# Altium schematic symbol library TI Power Management Shunt Voltage Reference.SchLib: 1526 symbols (part 18 of 18)
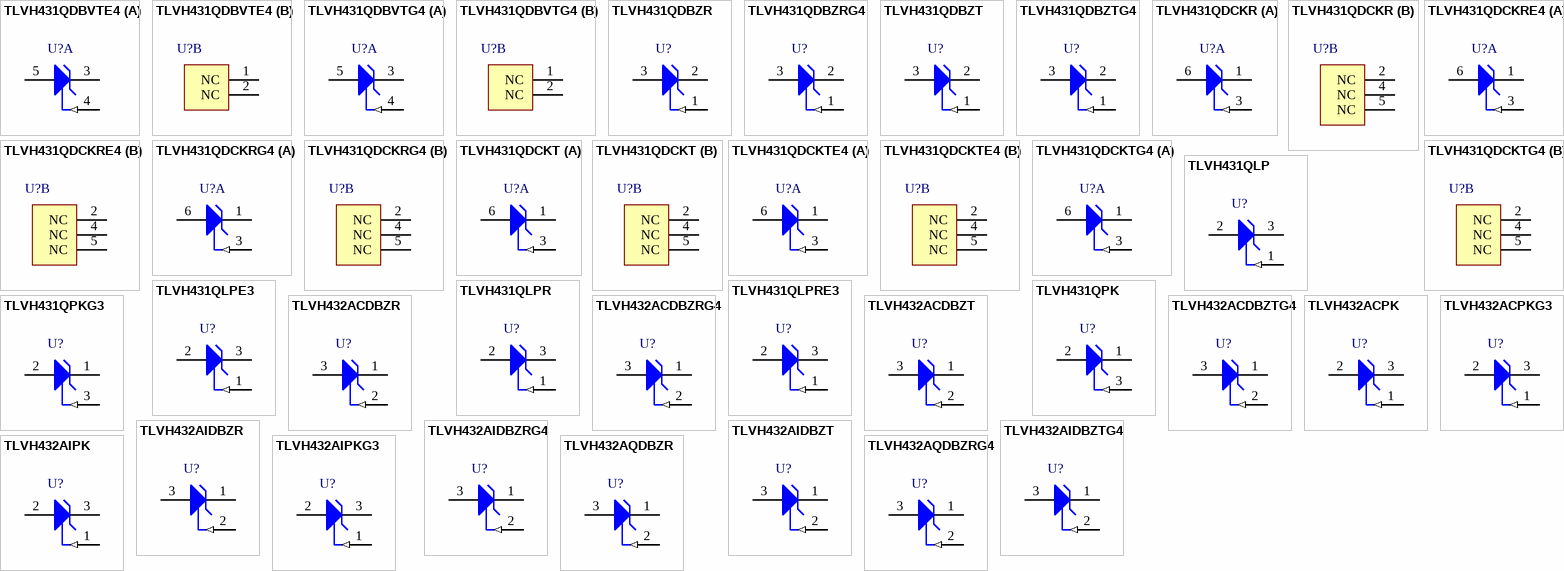
[diagram p74: symbols TLVH431QDBVTE4 to TLVH432AQDBZRG4]

## TLVH432ACDBZTG4
designator U?
Low-Voltage Adjustable Precision Shunt Regulator, 129 ppm / degC, 80 mA, 0 to 70 degC, 3-pin SOT-23 (DBZ), Green (RoHS & no Sb/Br); Manufacturer: Texas Instruments; PartNumber: TLVH432ACDBZTG4; Initial Accuracy @ 25/deg C(%): 1; Iout/Iz(Max)(mA): 80; Rating: Catalog; SubFamily: Shunt Voltage Reference; Temp Coeff(Max)(ppm/ degree C): 129; VO Adj(Max)(V): 18; VO Adj(Min)(V): 1.24; DatasheetVersion: SLVS555I; PackageVersion: 4203227/B; PackageReference: DBZ3; PackageDescription: 3-Pin Plastic Small Outline, Body 2.92 x 1.3 mm, Pitch 0.95 mm; Supplier 1: Digi-Key; Supplier Part Number 1: TLVH432ACDBZTG4-ND; Supplier 2: Mouser; Supplier Part Number 2: 595-TLVH432ACDBZTG4; Eco-Plan: Green (RoHS & no Sb/Br); Min Iz for Regulation(uA): 80; Mounting Technology: Surface Mount; Code_JEDEC: TO-236; ComponentLink1Description: Manufacturer URL; ComponentLink1URL: http://www.ti.com/; ComponentLink2Description: Datasheet; ComponentLink2URL: http://www.ti.com/general/docs/lit/getliterature.tsp?genericPartNumber=TLVH432A&fileType=pdf; ComponentLink3Description: Package Specification; ComponentLink3URL: http://www.ti.com/litv/pdf/mpds108a; ComponentLink4Description: URL Link1; ComponentLink4URL: Samples URL:http://www.ti.com/product/tlvh432a&lpos=Middle_Container&lid=Alternative_Devices
footprint TI-DBZ3_N (SOT23, 3-Leads, Body 2.92x1.3 mm, Pitch 0.95 mm, IPC Medium Density)
pins: 1 CATHODE, 2 REF (in), 3 ANODE

## TLVH432ACPK
designator U?
Low-Voltage Adjustable Precision Shunt Regulator, 129 ppm / degC, 80 mA, 0 to 70 degC, 3-pin SOT-89 (PK), Green (RoHS & no Sb/Br); Manufacturer: Texas Instruments; PartNumber: TLVH432ACPK; Initial Accuracy @ 25/deg C(%): 1; Iout/Iz(Max)(mA): 80; Rating: Catalog; SubFamily: Shunt Voltage Reference; Temp Coeff(Max)(ppm/ degree C): 129; VO Adj(Max)(V): 18; VO Adj(Min)(V): 1.24; DatasheetVersion: SLVS555I; PackageVersion: 4040234/D; PackageReference: PK3; PackageDescription: 3-Pin Plastic Small Outline, Body 2.5 x 4.5 mm, Pitch 1.5 mm; Supplier 1: Digi-Key; Supplier Part Number 1: 296-18628-2-ND; Supplier 2: Digi-Key; Supplier Part Number 2: 296-18628-1-ND; Supplier 3: Digi-Key; Supplier Part Number 3: 296-18628-6-ND; Supplier 4: Newark; Supplier Part Number 4: 57K1247; Supplier 5: Mouser; Supplier Part Number 5: 595-TLVH432ACPK; Eco-Plan: Green (RoHS & no Sb/Br); Min Iz for Regulation(uA): 80; Mounting Technology: Surface Mount; Code_JEDEC: TO-243; ComponentLink1Description: Manufacturer URL; ComponentLink1URL: http://www.ti.com/; ComponentLink2Description: Datasheet; ComponentLink2URL: http://www.ti.com/general/docs/lit/getliterature.tsp?genericPartNumber=TLVH432A&fileType=pdf; ComponentLink3Description: Package Specification; ComponentLink3URL: http://www.ti.com/litv/pdf/mhsi001b
footprint TI-PK3_N (SOT89, 3-Leads, Body 4.5x2.5mm, Pitch 1.5mm, IPC Medium Density)
pins: 1 REF (in), 2 ANODE, 3 CATHODE

## TLVH432ACPKG3
designator U?
Low-Voltage Adjustable Precision Shunt Regulator, 129 ppm / degC, 80 mA, 0 to 70 degC, 3-pin SOT-89 (PK), Green (RoHS & no Sb/Br); Manufacturer: Texas Instruments; PartNumber: TLVH432ACPKG3; Initial Accuracy @ 25/deg C(%): 1; Iout/Iz(Max)(mA): 80; Rating: Catalog; SubFamily: Shunt Voltage Reference; Temp Coeff(Max)(ppm/ degree C): 129; VO Adj(Max)(V): 18; VO Adj(Min)(V): 1.24; DatasheetVersion: SLVS555I; PackageVersion: 4040234/D; PackageReference: PK3; PackageDescription: 3-Pin Plastic Small Outline, Body 2.5 x 4.5 mm, Pitch 1.5 mm; Supplier 1: Digi-Key; Supplier Part Number 1: 296-19351-2-ND; Supplier 2: Digi-Key; Supplier Part Number 2: 296-19351-1-ND; Supplier 3: Digi-Key; Supplier Part Number 3: 296-19351-6-ND; Supplier 4: Mouser; Supplier Part Number 4: 595-TLVH432ACPKG3; Eco-Plan: Green (RoHS & no Sb/Br); Min Iz for Regulation(uA): 80; Mounting Technology: Surface Mount; Code_JEDEC: TO-243; ComponentLink1Description: Manufacturer URL; ComponentLink1URL: http://www.ti.com/; ComponentLink2Description: Datasheet; ComponentLink2URL: http://www.ti.com/general/docs/lit/getliterature.tsp?genericPartNumber=TLVH432A&fileType=pdf; ComponentLink3Description: Package Specification; ComponentLink3URL: http://www.ti.com/litv/pdf/mhsi001b
footprint TI-PK3_N (SOT89, 3-Leads, Body 4.5x2.5mm, Pitch 1.5mm, IPC Medium Density)
pins: 1 REF (in), 2 ANODE, 3 CATHODE

## TLVH432AIDBZR
designator U?
Low-Voltage Adjustable Precision Shunt Regulator, 129 ppm / degC, 80 mA, -40 to 85 degC, 3-pin SOT-23 (DBZ), Green (RoHS & no Sb/Br); Manufacturer: Texas Instruments; PartNumber: TLVH432AIDBZR; Initial Accuracy @ 25/deg C(%): 1; Iout/Iz(Max)(mA): 80; Rating: Catalog; SubFamily: Shunt Voltage Reference; Temp Coeff(Max)(ppm/ degree C): 129; VO Adj(Max)(V): 18; VO Adj(Min)(V): 1.24; DatasheetVersion: SLVS555I; PackageVersion: 4203227/B; PackageReference: DBZ3; PackageDescription: 3-Pin Plastic Small Outline, Body 2.92 x 1.3 mm, Pitch 0.95 mm; Supplier 1: Digi-Key; Supplier Part Number 1: 296-17977-2-ND; Supplier 2: Digi-Key; Supplier Part Number 2: 296-17977-1-ND; Supplier 3: Digi-Key; Supplier Part Number 3: 296-17977-6-ND; Supplier 4: Mouser; Supplier Part Number 4: 595-TLVH432AIDBZR; Eco-Plan: Green (RoHS & no Sb/Br); Min Iz for Regulation(uA): 80; Mounting Technology: Surface Mount; Code_JEDEC: TO-236; ComponentLink1Description: Manufacturer URL; ComponentLink1URL: http://www.ti.com/; ComponentLink2Description: Datasheet; ComponentLink2URL: http://www.ti.com/general/docs/lit/getliterature.tsp?genericPartNumber=TLVH432A&fileType=pdf; ComponentLink3Description: Package Specification; ComponentLink3URL: http://www.ti.com/litv/pdf/mpds108a
footprint TI-DBZ3_N (SOT23, 3-Leads, Body 2.92x1.3 mm, Pitch 0.95 mm, IPC Medium Density)
pins: 1 CATHODE, 2 REF (in), 3 ANODE

## TLVH432AIDBZRG4
designator U?
Low-Voltage Adjustable Precision Shunt Regulator, 129 ppm / degC, 80 mA, -40 to 85 degC, 3-pin SOT-23 (DBZ), Green (RoHS & no Sb/Br); Manufacturer: Texas Instruments; PartNumber: TLVH432AIDBZRG4; Initial Accuracy @ 25/deg C(%): 1; Iout/Iz(Max)(mA): 80; Rating: Catalog; SubFamily: Shunt Voltage Reference; Temp Coeff(Max)(ppm/ degree C): 129; VO Adj(Max)(V): 18; VO Adj(Min)(V): 1.24; DatasheetVersion: SLVS555I; PackageVersion: 4203227/B; PackageReference: DBZ3; PackageDescription: 3-Pin Plastic Small Outline, Body 2.92 x 1.3 mm, Pitch 0.95 mm; Supplier 1: Digi-Key; Supplier Part Number 1: TLVH432AIDBZRG4-ND; Supplier 2: Mouser; Supplier Part Number 2: 595-TLVH432AIDBZRG4; Eco-Plan: Green (RoHS & no Sb/Br); Min Iz for Regulation(uA): 80; Mounting Technology: Surface Mount; Code_JEDEC: TO-236; ComponentLink1Description: Manufacturer URL; ComponentLink1URL: http://www.ti.com/; ComponentLink2Description: Datasheet; ComponentLink2URL: http://www.ti.com/general/docs/lit/getliterature.tsp?genericPartNumber=TLVH432A&fileType=pdf; ComponentLink3Description: Package Specification; ComponentLink3URL: http://www.ti.com/litv/pdf/mpds108a
footprint TI-DBZ3_N (SOT23, 3-Leads, Body 2.92x1.3 mm, Pitch 0.95 mm, IPC Medium Density)
pins: 1 CATHODE, 2 REF (in), 3 ANODE

## TLVH432AIDBZT
designator U?
Low-Voltage Adjustable Precision Shunt Regulator, 129 ppm / degC, 80 mA, -40 to 85 degC, 3-pin SOT-23 (DBZ), Green (RoHS & no Sb/Br); Manufacturer: Texas Instruments; PartNumber: TLVH432AIDBZT; Initial Accuracy @ 25/deg C(%): 1; Iout/Iz(Max)(mA): 80; Rating: Catalog; SubFamily: Shunt Voltage Reference; Temp Coeff(Max)(ppm/ degree C): 129; VO Adj(Max)(V): 18; VO Adj(Min)(V): 1.24; DatasheetVersion: SLVS555I; PackageVersion: 4203227/B; PackageReference: DBZ3; PackageDescription: 3-Pin Plastic Small Outline, Body 2.92 x 1.3 mm, Pitch 0.95 mm; Supplier 1: Digi-Key; Supplier Part Number 1: TLVH432AIDBZT-ND; Supplier 2: Mouser; Supplier Part Number 2: 595-TLVH432AIDBZT; Eco-Plan: Green (RoHS & no Sb/Br); Min Iz for Regulation(uA): 80; Mounting Technology: Surface Mount; Code_JEDEC: TO-236; ComponentLink1Description: Manufacturer URL; ComponentLink1URL: http://www.ti.com/; ComponentLink2Description: Datasheet; ComponentLink2URL: http://www.ti.com/general/docs/lit/getliterature.tsp?genericPartNumber=TLVH432A&fileType=pdf; ComponentLink3Description: Package Specification; ComponentLink3URL: http://www.ti.com/litv/pdf/mpds108a; ComponentLink4Description: URL Link1; ComponentLink4URL: Samples URL:http://www.ti.com/product/tlvh432a&lpos=Middle_Container&lid=Alternative_Devices
footprint TI-DBZ3_N (SOT23, 3-Leads, Body 2.92x1.3 mm, Pitch 0.95 mm, IPC Medium Density)
pins: 1 CATHODE, 2 REF (in), 3 ANODE

## TLVH432AIDBZTG4
designator U?
Low-Voltage Adjustable Precision Shunt Regulator, 129 ppm / degC, 80 mA, -40 to 85 degC, 3-pin SOT-23 (DBZ), Green (RoHS & no Sb/Br); Manufacturer: Texas Instruments; PartNumber: TLVH432AIDBZTG4; Initial Accuracy @ 25/deg C(%): 1; Iout/Iz(Max)(mA): 80; Rating: Catalog; SubFamily: Shunt Voltage Reference; Temp Coeff(Max)(ppm/ degree C): 129; VO Adj(Max)(V): 18; VO Adj(Min)(V): 1.24; DatasheetVersion: SLVS555I; PackageVersion: 4203227/B; PackageReference: DBZ3; PackageDescription: 3-Pin Plastic Small Outline, Body 2.92 x 1.3 mm, Pitch 0.95 mm; Supplier 1: Digi-Key; Supplier Part Number 1: TLVH432AIDBZTG4-ND; Supplier 2: Mouser; Supplier Part Number 2: 595-TLVH432AIDBZTG4; Eco-Plan: Green (RoHS & no Sb/Br); Min Iz for Regulation(uA): 80; Mounting Technology: Surface Mount; Code_JEDEC: TO-236; ComponentLink1Description: Manufacturer URL; ComponentLink1URL: http://www.ti.com/; ComponentLink2Description: Datasheet; ComponentLink2URL: http://www.ti.com/general/docs/lit/getliterature.tsp?genericPartNumber=TLVH432A&fileType=pdf; ComponentLink3Description: Package Specification; ComponentLink3URL: http://www.ti.com/litv/pdf/mpds108a
footprint TI-DBZ3_N (SOT23, 3-Leads, Body 2.92x1.3 mm, Pitch 0.95 mm, IPC Medium Density)
pins: 1 CATHODE, 2 REF (in), 3 ANODE

## TLVH432AIPK
designator U?
Low-Voltage Adjustable Precision Shunt Regulator, 129 ppm / degC, 80 mA, -40 to 85 degC, 3-pin SOT-89 (PK), Green (RoHS & no Sb/Br); Manufacturer: Texas Instruments; PartNumber: TLVH432AIPK; Initial Accuracy @ 25/deg C(%): 1; Iout/Iz(Max)(mA): 80; Rating: Catalog; SubFamily: Shunt Voltage Reference; Temp Coeff(Max)(ppm/ degree C): 129; VO Adj(Max)(V): 18; VO Adj(Min)(V): 1.24; DatasheetVersion: SLVS555I; PackageVersion: 4040234/D; PackageReference: PK3; PackageDescription: 3-Pin Plastic Small Outline, Body 2.5 x 4.5 mm, Pitch 1.5 mm; Supplier 1: Digi-Key; Supplier Part Number 1: 296-18629-2-ND; Supplier 2: Digi-Key; Supplier Part Number 2: 296-18629-1-ND; Supplier 3: Digi-Key; Supplier Part Number 3: 296-18629-6-ND; Supplier 4: Newark; Supplier Part Number 4: 57K1248; Supplier 5: Mouser; Supplier Part Number 5: 595-TLVH432AIPK; Eco-Plan: Green (RoHS & no Sb/Br); Min Iz for Regulation(uA): 80; Mounting Technology: Surface Mount; Code_JEDEC: TO-243; ComponentLink1Description: Manufacturer URL; ComponentLink1URL: http://www.ti.com/; ComponentLink2Description: Datasheet; ComponentLink2URL: http://www.ti.com/general/docs/lit/getliterature.tsp?genericPartNumber=TLVH432A&fileType=pdf; ComponentLink3Description: Package Specification; ComponentLink3URL: http://www.ti.com/litv/pdf/mhsi001b; ComponentLink4Description: URL Link1; ComponentLink4URL: Samples URL:http://www.ti.com/product/tlvh432a&lpos=Middle_Container&lid=Alternative_Devices
footprint TI-PK3_N (SOT89, 3-Leads, Body 4.5x2.5mm, Pitch 1.5mm, IPC Medium Density)
pins: 1 REF (in), 2 ANODE, 3 CATHODE

## TLVH432AIPKG3
designator U?
Low-Voltage Adjustable Precision Shunt Regulator, 129 ppm / degC, 80 mA, -40 to 85 degC, 3-pin SOT-89 (PK), Green (RoHS & no Sb/Br); Manufacturer: Texas Instruments; PartNumber: TLVH432AIPKG3; Initial Accuracy @ 25/deg C(%): 1; Iout/Iz(Max)(mA): 80; Rating: Catalog; SubFamily: Shunt Voltage Reference; Temp Coeff(Max)(ppm/ degree C): 129; VO Adj(Max)(V): 18; VO Adj(Min)(V): 1.24; DatasheetVersion: SLVS555I; PackageVersion: 4040234/D; PackageReference: PK3; PackageDescription: 3-Pin Plastic Small Outline, Body 2.5 x 4.5 mm, Pitch 1.5 mm; Supplier 1: Digi-Key; Supplier Part Number 1: 296-19352-2-ND; Supplier 2: Digi-Key; Supplier Part Number 2: 296-19352-1-ND; Supplier 3: Digi-Key; Supplier Part Number 3: 296-19352-6-ND; Supplier 4: Newark; Supplier Part Number 4: 66K4401; Supplier 5: Mouser; Supplier Part Number 5: 595-TLVH432AIPKG3; Eco-Plan: Green (RoHS & no Sb/Br); Min Iz for Regulation(uA): 80; Mounting Technology: Surface Mount; Code_JEDEC: TO-243; ComponentLink1Description: Manufacturer URL; ComponentLink1URL: http://www.ti.com/; ComponentLink2Description: Datasheet; ComponentLink2URL: http://www.ti.com/general/docs/lit/getliterature.tsp?genericPartNumber=TLVH432A&fileType=pdf; ComponentLink3Description: Package Specification; ComponentLink3URL: http://www.ti.com/litv/pdf/mhsi001b
footprint TI-PK3_N (SOT89, 3-Leads, Body 4.5x2.5mm, Pitch 1.5mm, IPC Medium Density)
pins: 1 REF (in), 2 ANODE, 3 CATHODE

## TLVH432AQDBZR
designator U?
Low-Voltage Adjustable Precision Shunt Regulator, 129 ppm / degC, 80 mA, -40 to 125 degC, 3-pin SOT-23 (DBZ), Green (RoHS & no Sb/Br); Manufacturer: Texas Instruments; PartNumber: TLVH432AQDBZR; Initial Accuracy @ 25/deg C(%): 1; Iout/Iz(Max)(mA): 80; Rating: Catalog; SubFamily: Shunt Voltage Reference; Temp Coeff(Max)(ppm/ degree C): 129; VO Adj(Max)(V): 18; VO Adj(Min)(V): 1.24; DatasheetVersion: SLVS555I; PackageVersion: 4203227/B; PackageReference: DBZ3; PackageDescription: 3-Pin Plastic Small Outline, Body 2.92 x 1.3 mm, Pitch 0.95 mm; Supplier 1: Digi-Key; Supplier Part Number 1: 296-17978-2-ND; Supplier 2: Digi-Key; Supplier Part Number 2: 296-17978-1-ND; Supplier 3: Digi-Key; Supplier Part Number 3: 296-17978-6-ND; Supplier 4: Newark; Supplier Part Number 4: 31K7685; Supplier 5: Mouser; Supplier Part Number 5: 595-TLVH432AQDBZR; Eco-Plan: Green (RoHS & no Sb/Br); Min Iz for Regulation(uA): 80; Mounting Technology: Surface Mount; Code_JEDEC: TO-236; ComponentLink1Description: Manufacturer URL; ComponentLink1URL: http://www.ti.com/; ComponentLink2Description: Datasheet; ComponentLink2URL: http://www.ti.com/general/docs/lit/getliterature.tsp?genericPartNumber=TLVH432A&fileType=pdf; ComponentLink3Description: Package Specification; ComponentLink3URL: http://www.ti.com/litv/pdf/mpds108a
footprint TI-DBZ3_N (SOT23, 3-Leads, Body 2.92x1.3 mm, Pitch 0.95 mm, IPC Medium Density)
pins: 1 CATHODE, 2 REF (in), 3 ANODE

## TLVH432AQDBZRG4
designator U?
Low-Voltage Adjustable Precision Shunt Regulator, 129 ppm / degC, 80 mA, -40 to 125 degC, 3-pin SOT-23 (DBZ), Green (RoHS & no Sb/Br); Manufacturer: Texas Instruments; PartNumber: TLVH432AQDBZRG4; Initial Accuracy @ 25/deg C(%): 1; Iout/Iz(Max)(mA): 80; Rating: Catalog; SubFamily: Shunt Voltage Reference; Temp Coeff(Max)(ppm/ degree C): 129; VO Adj(Max)(V): 18; VO Adj(Min)(V): 1.24; DatasheetVersion: SLVS555I; PackageVersion: 4203227/B; PackageReference: DBZ3; PackageDescription: 3-Pin Plastic Small Outline, Body 2.92 x 1.3 mm, Pitch 0.95 mm; Supplier 1: Digi-Key; Supplier Part Number 1: TLVH432AQDBZRG4-ND; Supplier 2: Mouser; Supplier Part Number 2: 595-TLVH432AQDBZRG4; Eco-Plan: Green (RoHS & no Sb/Br); Min Iz for Regulation(uA): 80; Mounting Technology: Surface Mount; Code_JEDEC: TO-236; ComponentLink1Description: Manufacturer URL; ComponentLink1URL: http://www.ti.com/; ComponentLink2Description: Datasheet; ComponentLink2URL: http://www.ti.com/general/docs/lit/getliterature.tsp?genericPartNumber=TLVH432A&fileType=pdf; ComponentLink3Description: Package Specification; ComponentLink3URL: http://www.ti.com/litv/pdf/mpds108a
footprint TI-DBZ3_N (SOT23, 3-Leads, Body 2.92x1.3 mm, Pitch 0.95 mm, IPC Medium Density)
pins: 1 CATHODE, 2 REF (in), 3 ANODE

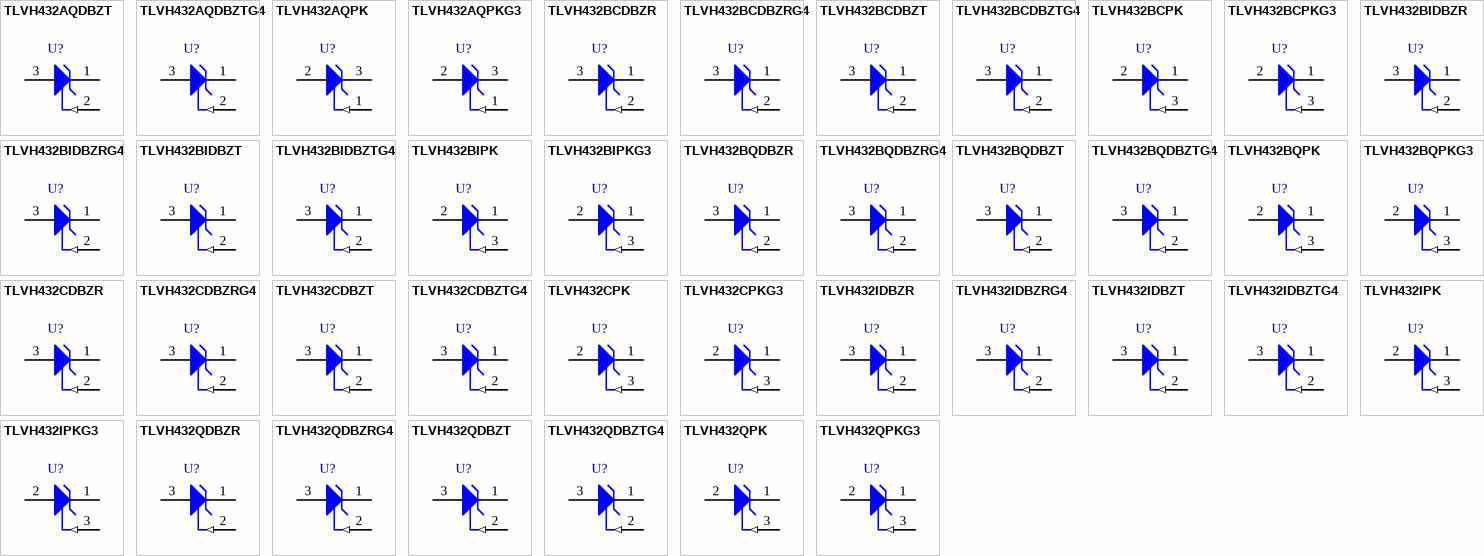
[diagram p56: symbols TLVH432AQDBZT to TLVH432QPKG3]

## TLVH432AQDBZT
designator U?
Low-Voltage Adjustable Precision Shunt Regulator, 129 ppm / degC, 80 mA, -40 to 125 degC, 3-pin SOT-23 (DBZ), Green (RoHS & no Sb/Br); Manufacturer: Texas Instruments; PartNumber: TLVH432AQDBZT; Initial Accuracy @ 25/deg C(%): 1; Iout/Iz(Max)(mA): 80; Rating: Catalog; SubFamily: Shunt Voltage Reference; Temp Coeff(Max)(ppm/ degree C): 129; VO Adj(Max)(V): 18; VO Adj(Min)(V): 1.24; DatasheetVersion: SLVS555I; PackageVersion: 4203227/B; PackageReference: DBZ3; PackageDescription: 3-Pin Plastic Small Outline, Body 2.92 x 1.3 mm, Pitch 0.95 mm; Supplier 1: Digi-Key; Supplier Part Number 1: TLVH432AQDBZT-ND; Supplier 2: Mouser; Supplier Part Number 2: 595-TLVH432AQDBZT; Eco-Plan: Green (RoHS & no Sb/Br); Min Iz for Regulation(uA): 80; Mounting Technology: Surface Mount; Code_JEDEC: TO-236; ComponentLink1Description: Manufacturer URL; ComponentLink1URL: http://www.ti.com/; ComponentLink2Description: Datasheet; ComponentLink2URL: http://www.ti.com/general/docs/lit/getliterature.tsp?genericPartNumber=TLVH432A&fileType=pdf; ComponentLink3Description: Package Specification; ComponentLink3URL: http://www.ti.com/litv/pdf/mpds108a
footprint TI-DBZ3_N (SOT23, 3-Leads, Body 2.92x1.3 mm, Pitch 0.95 mm, IPC Medium Density)
pins: 1 CATHODE, 2 REF (in), 3 ANODE

## TLVH432AQDBZTG4
designator U?
Low-Voltage Adjustable Precision Shunt Regulator, 129 ppm / degC, 80 mA, -40 to 125 degC, 3-pin SOT-23 (DBZ), Green (RoHS & no Sb/Br); Manufacturer: Texas Instruments; PartNumber: TLVH432AQDBZTG4; Initial Accuracy @ 25/deg C(%): 1; Iout/Iz(Max)(mA): 80; Rating: Catalog; SubFamily: Shunt Voltage Reference; Temp Coeff(Max)(ppm/ degree C): 129; VO Adj(Max)(V): 18; VO Adj(Min)(V): 1.24; DatasheetVersion: SLVS555I; PackageVersion: 4203227/B; PackageReference: DBZ3; PackageDescription: 3-Pin Plastic Small Outline, Body 2.92 x 1.3 mm, Pitch 0.95 mm; Supplier 1: Digi-Key; Supplier Part Number 1: TLVH432AQDBZTG4-ND; Supplier 2: Mouser; Supplier Part Number 2: 595-TLVH432AQDBZTG4; Eco-Plan: Green (RoHS & no Sb/Br); Min Iz for Regulation(uA): 80; Mounting Technology: Surface Mount; Code_JEDEC: TO-236; ComponentLink1Description: Manufacturer URL; ComponentLink1URL: http://www.ti.com/; ComponentLink2Description: Datasheet; ComponentLink2URL: http://www.ti.com/general/docs/lit/getliterature.tsp?genericPartNumber=TLVH432A&fileType=pdf; ComponentLink3Description: Package Specification; ComponentLink3URL: http://www.ti.com/litv/pdf/mpds108a; ComponentLink4Description: URL Link1; ComponentLink4URL: Samples URL:http://www.ti.com/product/tlvh432a&lpos=Middle_Container&lid=Alternative_Devices
footprint TI-DBZ3_N (SOT23, 3-Leads, Body 2.92x1.3 mm, Pitch 0.95 mm, IPC Medium Density)
pins: 1 CATHODE, 2 REF (in), 3 ANODE

## TLVH432AQPK
designator U?
Low-Voltage Adjustable Precision Shunt Regulator, 129 ppm / degC, 80 mA, -40 to 125 degC, 3-pin SOT-89 (PK), Green (RoHS & no Sb/Br); Manufacturer: Texas Instruments; PartNumber: TLVH432AQPK; Initial Accuracy @ 25/deg C(%): 1; Iout/Iz(Max)(mA): 80; Rating: Catalog; SubFamily: Shunt Voltage Reference; Temp Coeff(Max)(ppm/ degree C): 129; VO Adj(Max)(V): 18; VO Adj(Min)(V): 1.24; DatasheetVersion: SLVS555I; PackageVersion: 4040234/D; PackageReference: PK3; PackageDescription: 3-Pin Plastic Small Outline, Body 2.5 x 4.5 mm, Pitch 1.5 mm; Supplier 1: Digi-Key; Supplier Part Number 1: 296-18630-2-ND; Supplier 2: Digi-Key; Supplier Part Number 2: 296-18630-1-ND; Supplier 3: Digi-Key; Supplier Part Number 3: 296-18630-6-ND; Supplier 4: Mouser; Supplier Part Number 4: 595-TLVH432AQPK; Eco-Plan: Green (RoHS & no Sb/Br); Min Iz for Regulation(uA): 80; Mounting Technology: Surface Mount; Code_JEDEC: TO-243; ComponentLink1Description: Manufacturer URL; ComponentLink1URL: http://www.ti.com/; ComponentLink2Description: Datasheet; ComponentLink2URL: http://www.ti.com/general/docs/lit/getliterature.tsp?genericPartNumber=TLVH432A&fileType=pdf; ComponentLink3Description: Package Specification; ComponentLink3URL: http://www.ti.com/litv/pdf/mhsi001b; ComponentLink4Description: URL Link1; ComponentLink4URL: Samples URL:http://www.ti.com/product/tlvh432a
footprint TI-PK3_N (SOT89, 3-Leads, Body 4.5x2.5mm, Pitch 1.5mm, IPC Medium Density)
pins: 1 REF (in), 2 ANODE, 3 CATHODE

## TLVH432AQPKG3
designator U?
Low-Voltage Adjustable Precision Shunt Regulator, 129 ppm / degC, 80 mA, -40 to 125 degC, 3-pin SOT-89 (PK), Green (RoHS & no Sb/Br); Manufacturer: Texas Instruments; PartNumber: TLVH432AQPKG3; Initial Accuracy @ 25/deg C(%): 1; Iout/Iz(Max)(mA): 80; Rating: Catalog; SubFamily: Shunt Voltage Reference; Temp Coeff(Max)(ppm/ degree C): 129; VO Adj(Max)(V): 18; VO Adj(Min)(V): 1.24; DatasheetVersion: SLVS555I; PackageVersion: 4040234/D; PackageReference: PK3; PackageDescription: 3-Pin Plastic Small Outline, Body 2.5 x 4.5 mm, Pitch 1.5 mm; Supplier 1: Digi-Key; Supplier Part Number 1: 296-19353-2-ND; Supplier 2: Digi-Key; Supplier Part Number 2: 296-19353-1-ND; Supplier 3: Digi-Key; Supplier Part Number 3: 296-19353-6-ND; Supplier 4: Mouser; Supplier Part Number 4: 595-TLVH432AQPKG3; Eco-Plan: Green (RoHS & no Sb/Br); Min Iz for Regulation(uA): 80; Mounting Technology: Surface Mount; Code_JEDEC: TO-243; ComponentLink1Description: Manufacturer URL; ComponentLink1URL: http://www.ti.com/; ComponentLink2Description: Datasheet; ComponentLink2URL: http://www.ti.com/general/docs/lit/getliterature.tsp?genericPartNumber=TLVH432A&fileType=pdf; ComponentLink3Description: Package Specification; ComponentLink3URL: http://www.ti.com/litv/pdf/mhsi001b; ComponentLink4Description: URL Link1; ComponentLink4URL: Samples URL:http://www.ti.com/product/tlvh432a
footprint TI-PK3_N (SOT89, 3-Leads, Body 4.5x2.5mm, Pitch 1.5mm, IPC Medium Density)
pins: 1 REF (in), 2 ANODE, 3 CATHODE

## TLVH432BCDBZR
designator U?
Low-Voltage Adjustable Precision Shunt Regulator, 129 ppm / degC, 80 mA, 0 to 70 degC, 3-pin SOT-23 (DBZ), Green (RoHS & no Sb/Br); Manufacturer: Texas Instruments; PartNumber: TLVH432BCDBZR; Initial Accuracy @ 25/deg C(%): 0.5; Iout/Iz(Max)(mA): 80; Rating: Catalog; SubFamily: Shunt Voltage Reference; Temp Coeff(Max)(ppm/ degree C): 129; VO Adj(Max)(V): 18; VO Adj(Min)(V): 1.24; DatasheetVersion: SLVS555I; PackageVersion: 4203227/B; PackageReference: DBZ3; PackageDescription: 3-Pin Plastic Small Outline, Body 2.92 x 1.3 mm, Pitch 0.95 mm; Supplier 1: Digi-Key; Supplier Part Number 1: 296-17979-2-ND; Supplier 2: Digi-Key; Supplier Part Number 2: 296-17979-1-ND; Supplier 3: Digi-Key; Supplier Part Number 3: 296-17979-6-ND; Supplier 4: Newark; Supplier Part Number 4: 31K7689; Supplier 5: Mouser; Supplier Part Number 5: 595-TLVH432BCDBZR; Eco-Plan: Green (RoHS & no Sb/Br); Min Iz for Regulation(uA): 80; Mounting Technology: Surface Mount; Code_JEDEC: TO-236; ComponentLink1Description: Manufacturer URL; ComponentLink1URL: http://www.ti.com/; ComponentLink2Description: Datasheet; ComponentLink2URL: http://www.ti.com/general/docs/lit/getliterature.tsp?genericPartNumber=TLVH432B&fileType=pdf; ComponentLink3Description: Package Specification; ComponentLink3URL: http://www.ti.com/litv/pdf/mpds108a
footprint TI-DBZ3_N (SOT23, 3-Leads, Body 2.92x1.3 mm, Pitch 0.95 mm, IPC Medium Density)
pins: 1 CATHODE, 2 REF (in), 3 ANODE

## TLVH432BCDBZRG4
designator U?
Low-Voltage Adjustable Precision Shunt Regulator, 129 ppm / degC, 80 mA, 0 to 70 degC, 3-pin SOT-23 (DBZ), Green (RoHS & no Sb/Br); Manufacturer: Texas Instruments; PartNumber: TLVH432BCDBZRG4; Initial Accuracy @ 25/deg C(%): 0.5; Iout/Iz(Max)(mA): 80; Rating: Catalog; SubFamily: Shunt Voltage Reference; Temp Coeff(Max)(ppm/ degree C): 129; VO Adj(Max)(V): 18; VO Adj(Min)(V): 1.24; DatasheetVersion: SLVS555I; PackageVersion: 4203227/B; PackageReference: DBZ3; PackageDescription: 3-Pin Plastic Small Outline, Body 2.92 x 1.3 mm, Pitch 0.95 mm; Supplier 1: Digi-Key; Supplier Part Number 1: TLVH432BCDBZRG4-ND; Supplier 2: Mouser; Supplier Part Number 2: 595-TLVH432BCDBZRG4; Eco-Plan: Green (RoHS & no Sb/Br); Min Iz for Regulation(uA): 80; Mounting Technology: Surface Mount; Code_JEDEC: TO-236; ComponentLink1Description: Manufacturer URL; ComponentLink1URL: http://www.ti.com/; ComponentLink2Description: Datasheet; ComponentLink2URL: http://www.ti.com/general/docs/lit/getliterature.tsp?genericPartNumber=TLVH432B&fileType=pdf; ComponentLink3Description: Package Specification; ComponentLink3URL: http://www.ti.com/litv/pdf/mpds108a
footprint TI-DBZ3_N (SOT23, 3-Leads, Body 2.92x1.3 mm, Pitch 0.95 mm, IPC Medium Density)
pins: 1 CATHODE, 2 REF (in), 3 ANODE

## TLVH432BCDBZT
designator U?
Low-Voltage Adjustable Precision Shunt Regulator, 129 ppm / degC, 80 mA, 0 to 70 degC, 3-pin SOT-23 (DBZ), Green (RoHS & no Sb/Br); Manufacturer: Texas Instruments; PartNumber: TLVH432BCDBZT; Initial Accuracy @ 25/deg C(%): 0.5; Iout/Iz(Max)(mA): 80; Rating: Catalog; SubFamily: Shunt Voltage Reference; Temp Coeff(Max)(ppm/ degree C): 129; VO Adj(Max)(V): 18; VO Adj(Min)(V): 1.24; DatasheetVersion: SLVS555I; PackageVersion: 4203227/B; PackageReference: DBZ3; PackageDescription: 3-Pin Plastic Small Outline, Body 2.92 x 1.3 mm, Pitch 0.95 mm; Supplier 1: Digi-Key; Supplier Part Number 1: TLVH432BCDBZT-ND; Supplier 2: Mouser; Supplier Part Number 2: 595-TLVH432BCDBZT; Eco-Plan: Green (RoHS & no Sb/Br); Min Iz for Regulation(uA): 80; Mounting Technology: Surface Mount; Code_JEDEC: TO-236; ComponentLink1Description: Manufacturer URL; ComponentLink1URL: http://www.ti.com/; ComponentLink2Description: Datasheet; ComponentLink2URL: http://www.ti.com/general/docs/lit/getliterature.tsp?genericPartNumber=TLVH432B&fileType=pdf; ComponentLink3Description: Package Specification; ComponentLink3URL: http://www.ti.com/litv/pdf/mpds108a
footprint TI-DBZ3_N (SOT23, 3-Leads, Body 2.92x1.3 mm, Pitch 0.95 mm, IPC Medium Density)
pins: 1 CATHODE, 2 REF (in), 3 ANODE

## TLVH432BCDBZTG4
designator U?
Low-Voltage Adjustable Precision Shunt Regulator, 129 ppm / degC, 80 mA, 0 to 70 degC, 3-pin SOT-23 (DBZ), Green (RoHS & no Sb/Br); Manufacturer: Texas Instruments; PartNumber: TLVH432BCDBZTG4; Initial Accuracy @ 25/deg C(%): 0.5; Iout/Iz(Max)(mA): 80; Rating: Catalog; SubFamily: Shunt Voltage Reference; Temp Coeff(Max)(ppm/ degree C): 129; VO Adj(Max)(V): 18; VO Adj(Min)(V): 1.24; DatasheetVersion: SLVS555I; PackageVersion: 4203227/B; PackageReference: DBZ3; PackageDescription: 3-Pin Plastic Small Outline, Body 2.92 x 1.3 mm, Pitch 0.95 mm; Supplier 1: Digi-Key; Supplier Part Number 1: TLVH432BCDBZTG4-ND; Supplier 2: Mouser; Supplier Part Number 2: 595-TLVH432BCDBZTG4; Eco-Plan: Green (RoHS & no Sb/Br); Min Iz for Regulation(uA): 80; Mounting Technology: Surface Mount; Code_JEDEC: TO-236; ComponentLink1Description: Manufacturer URL; ComponentLink1URL: http://www.ti.com/; ComponentLink2Description: Datasheet; ComponentLink2URL: http://www.ti.com/general/docs/lit/getliterature.tsp?genericPartNumber=TLVH432B&fileType=pdf; ComponentLink3Description: Package Specification; ComponentLink3URL: http://www.ti.com/litv/pdf/mpds108a
footprint TI-DBZ3_N (SOT23, 3-Leads, Body 2.92x1.3 mm, Pitch 0.95 mm, IPC Medium Density)
pins: 1 CATHODE, 2 REF (in), 3 ANODE

## TLVH432BCPK
designator U?
Low-Voltage Adjustable Precision Shunt Regulator, 129 ppm / degC, 80 mA, 0 to 70 degC, 3-pin SOT-89 (PK), Green (RoHS & no Sb/Br); Manufacturer: Texas Instruments; PartNumber: TLVH432BCPK; Initial Accuracy @ 25/deg C(%): 0.5; Iout/Iz(Max)(mA): 80; Rating: Catalog; SubFamily: Shunt Voltage Reference; Temp Coeff(Max)(ppm/ degree C): 129; VO Adj(Max)(V): 18; VO Adj(Min)(V): 1.24; DatasheetVersion: SLVS555I; PackageVersion: 4040234/D; PackageReference: PK3; PackageDescription: 3-Pin Plastic Small Outline, Body 2.5 x 4.5 mm, Pitch 1.5 mm; Supplier 1: Digi-Key; Supplier Part Number 1: 296-18631-2-ND; Supplier 2: Digi-Key; Supplier Part Number 2: 296-18631-1-ND; Supplier 3: Digi-Key; Supplier Part Number 3: 296-18631-6-ND; Supplier 4: Newark; Supplier Part Number 4: 57K1250; Supplier 5: Mouser; Supplier Part Number 5: 595-TLVH432BCPK; Eco-Plan: Green (RoHS & no Sb/Br); Min Iz for Regulation(uA): 80; Mounting Technology: Surface Mount; Code_JEDEC: TO-243; ComponentLink1Description: Manufacturer URL; ComponentLink1URL: http://www.ti.com/; ComponentLink2Description: Datasheet; ComponentLink2URL: http://www.ti.com/general/docs/lit/getliterature.tsp?genericPartNumber=TLVH432B&fileType=pdf; ComponentLink3Description: Package Specification; ComponentLink3URL: http://www.ti.com/litv/pdf/mhsi001b
footprint TI-PK3_N (SOT89, 3-Leads, Body 4.5x2.5mm, Pitch 1.5mm, IPC Medium Density)
pins: 1 CATHODE, 2 ANODE, 3 REF (in)

## TLVH432BCPKG3
designator U?
Low-Voltage Adjustable Precision Shunt Regulator, 129 ppm / degC, 80 mA, 0 to 70 degC, 3-pin SOT-89 (PK), Green (RoHS & no Sb/Br); Manufacturer: Texas Instruments; PartNumber: TLVH432BCPKG3; Initial Accuracy @ 25/deg C(%): 0.5; Iout/Iz(Max)(mA): 80; Rating: Catalog; SubFamily: Shunt Voltage Reference; Temp Coeff(Max)(ppm/ degree C): 129; VO Adj(Max)(V): 18; VO Adj(Min)(V): 1.24; DatasheetVersion: SLVS555I; PackageVersion: 4040234/D; PackageReference: PK3; PackageDescription: 3-Pin Plastic Small Outline, Body 2.5 x 4.5 mm, Pitch 1.5 mm; Supplier 1: Digi-Key; Supplier Part Number 1: 296-19354-2-ND; Supplier 2: Digi-Key; Supplier Part Number 2: 296-19354-1-ND; Supplier 3: Digi-Key; Supplier Part Number 3: 296-19354-6-ND; Supplier 4: Mouser; Supplier Part Number 4: 595-TLVH432BCPKG3; Eco-Plan: Green (RoHS & no Sb/Br); Min Iz for Regulation(uA): 80; Mounting Technology: Surface Mount; Code_JEDEC: TO-243; ComponentLink1Description: Manufacturer URL; ComponentLink1URL: http://www.ti.com/; ComponentLink2Description: Datasheet; ComponentLink2URL: http://www.ti.com/general/docs/lit/getliterature.tsp?genericPartNumber=TLVH432B&fileType=pdf; ComponentLink3Description: Package Specification; ComponentLink3URL: http://www.ti.com/litv/pdf/mhsi001b
footprint TI-PK3_N (SOT89, 3-Leads, Body 4.5x2.5mm, Pitch 1.5mm, IPC Medium Density)
pins: 1 CATHODE, 2 ANODE, 3 REF (in)

## TLVH432BIDBZR
designator U?
Low-Voltage Adjustable Precision Shunt Regulator, 1.24 to 18 V, 80 mA, -40 to 85 degC, 3- pin SOT-23 (DBZ), Green (RoHS & no Sb/Br); Manufacturer: Texas Instruments; PartNumber: TLVH432BIDBZR; Initial Accuracy @ 25/deg C(%): 0.5; Iout/Iz(Max)(mA): 80; Rating: Catalog; SubFamily: Shunt Voltage Reference; Temp Coeff(Max)(ppm/ degree C): 129; VO Adj(Max)(V): 18; VO Adj(Min)(V): 1.24; DatasheetVersion: SLVS555I; PackageVersion: 4203227/B; PackageReference: DBZ3; PackageDescription: 3-Pin Plastic Small Outline, Body 2.92 x 1.3 mm, Pitch 0.95 mm; Supplier 1: Digi-Key; Supplier Part Number 1: 296-17980-2-ND; Supplier 2: Digi-Key; Supplier Part Number 2: 296-17980-1-ND; Supplier 3: Digi-Key; Supplier Part Number 3: 296-17980-6-ND; Supplier 4: Newark; Supplier Part Number 4: 31K7693; Supplier 5: Mouser; Supplier Part Number 5: 595-TLVH432BIDBZR; Eco-Plan: Green (RoHS & no Sb/Br); Min Iz for Regulation(uA): 80; Mounting Technology: Surface Mount; Code_JEDEC: TO-236; ComponentLink1Description: Manufacturer URL; ComponentLink1URL: http://www.ti.com/; ComponentLink2Description: Datasheet; ComponentLink2URL: http://www.ti.com/general/docs/lit/getliterature.tsp?genericPartNumber=TLVH432B&fileType=pdf; ComponentLink3Description: Package Specification; ComponentLink3URL: http://www.ti.com/litv/pdf/mpds108a
footprint TI-DBZ3_N (SOT23, 3-Leads, Body 2.92x1.3 mm, Pitch 0.95 mm, IPC Medium Density)
pins: 1 CATHODE, 2 REF (in), 3 ANODE

## TLVH432BIDBZRG4
designator U?
Low-Voltage Adjustable Precision Shunt Regulator, 1.24 to 18 V, 80 mA, -40 to 85 degC, 3- pin SOT-23 (DBZ), Green (RoHS & no Sb/Br); Manufacturer: Texas Instruments; PartNumber: TLVH432BIDBZRG4; Initial Accuracy @ 25/deg C(%): 0.5; Iout/Iz(Max)(mA): 80; Rating: Catalog; SubFamily: Shunt Voltage Reference; Temp Coeff(Max)(ppm/ degree C): 129; VO Adj(Max)(V): 18; VO Adj(Min)(V): 1.24; DatasheetVersion: SLVS555I; PackageVersion: 4203227/B; PackageReference: DBZ3; PackageDescription: 3-Pin Plastic Small Outline, Body 2.92 x 1.3 mm, Pitch 0.95 mm; Supplier 1: Digi-Key; Supplier Part Number 1: TLVH432BIDBZRG4-ND; Supplier 2: Mouser; Supplier Part Number 2: 595-TLVH432BIDBZRG4; Eco-Plan: Green (RoHS & no Sb/Br); Min Iz for Regulation(uA): 80; Mounting Technology: Surface Mount; Code_JEDEC: TO-236; ComponentLink1Description: Manufacturer URL; ComponentLink1URL: http://www.ti.com/; ComponentLink2Description: Datasheet; ComponentLink2URL: http://www.ti.com/general/docs/lit/getliterature.tsp?genericPartNumber=TLVH432B&fileType=pdf; ComponentLink3Description: Package Specification; ComponentLink3URL: http://www.ti.com/litv/pdf/mpds108a
footprint TI-DBZ3_N (SOT23, 3-Leads, Body 2.92x1.3 mm, Pitch 0.95 mm, IPC Medium Density)
pins: 1 CATHODE, 2 REF (in), 3 ANODE

## TLVH432BIDBZT
designator U?
Low-Voltage Adjustable Precision Shunt Regulator, 1.24 to 18 V, 80 mA, -40 to 85 degC, 3- pin SOT-23 (DBZ), Green (RoHS & no Sb/Br); Manufacturer: Texas Instruments; PartNumber: TLVH432BIDBZT; Initial Accuracy @ 25/deg C(%): 0.5; Iout/Iz(Max)(mA): 80; Rating: Catalog; SubFamily: Shunt Voltage Reference; Temp Coeff(Max)(ppm/ degree C): 129; VO Adj(Max)(V): 18; VO Adj(Min)(V): 1.24; DatasheetVersion: SLVS555I; PackageVersion: 4203227/B; PackageReference: DBZ3; PackageDescription: 3-Pin Plastic Small Outline, Body 2.92 x 1.3 mm, Pitch 0.95 mm; Supplier 1: Digi-Key; Supplier Part Number 1: TLVH432BIDBZT-ND; Supplier 2: Mouser; Supplier Part Number 2: 595-TLVH432BIDBZT; Eco-Plan: Green (RoHS & no Sb/Br); Min Iz for Regulation(uA): 80; Mounting Technology: Surface Mount; Code_JEDEC: TO-236; ComponentLink1Description: Manufacturer URL; ComponentLink1URL: http://www.ti.com/; ComponentLink2Description: Datasheet; ComponentLink2URL: http://www.ti.com/general/docs/lit/getliterature.tsp?genericPartNumber=TLVH432B&fileType=pdf; ComponentLink3Description: Package Specification; ComponentLink3URL: http://www.ti.com/litv/pdf/mpds108a
footprint TI-DBZ3_N (SOT23, 3-Leads, Body 2.92x1.3 mm, Pitch 0.95 mm, IPC Medium Density)
pins: 1 CATHODE, 2 REF (in), 3 ANODE

## TLVH432BIDBZTG4
designator U?
Low-Voltage Adjustable Precision Shunt Regulator, 1.24 to 18 V, 80 mA, -40 to 85 degC, 3- pin SOT-23 (DBZ), Green (RoHS & no Sb/Br); Manufacturer: Texas Instruments; PartNumber: TLVH432BIDBZTG4; Initial Accuracy @ 25/deg C(%): 0.5; Iout/Iz(Max)(mA): 80; Rating: Catalog; SubFamily: Shunt Voltage Reference; Temp Coeff(Max)(ppm/ degree C): 129; VO Adj(Max)(V): 18; VO Adj(Min)(V): 1.24; DatasheetVersion: SLVS555I; PackageVersion: 4203227/B; PackageReference: DBZ3; PackageDescription: 3-Pin Plastic Small Outline, Body 2.92 x 1.3 mm, Pitch 0.95 mm; Supplier 1: Digi-Key; Supplier Part Number 1: TLVH432BIDBZTG4-ND; Supplier 2: Mouser; Supplier Part Number 2: 595-TLVH432BIDBZTG4; Eco-Plan: Green (RoHS & no Sb/Br); Min Iz for Regulation(uA): 80; Mounting Technology: Surface Mount; Code_JEDEC: TO-236; ComponentLink1Description: Manufacturer URL; ComponentLink1URL: http://www.ti.com/; ComponentLink2Description: Datasheet; ComponentLink2URL: http://www.ti.com/general/docs/lit/getliterature.tsp?genericPartNumber=TLVH432B&fileType=pdf; ComponentLink3Description: Package Specification; ComponentLink3URL: http://www.ti.com/litv/pdf/mpds108a
footprint TI-DBZ3_N (SOT23, 3-Leads, Body 2.92x1.3 mm, Pitch 0.95 mm, IPC Medium Density)
pins: 1 CATHODE, 2 REF (in), 3 ANODE
